# Altium footprint library 04.连接器件.pcb.PCBLIB: 363 footprints (part 18 of 23)
Each footprint in its own frame and in the unit in brackets; x right, y up, seen from the top. Pads: shape width x height; smd on the part's side, far side on the other; paste and mask are expansions set on the pad; w line width, h text height; cw(c..) or ccw(c..) is an arc to the next point about the centre after c.
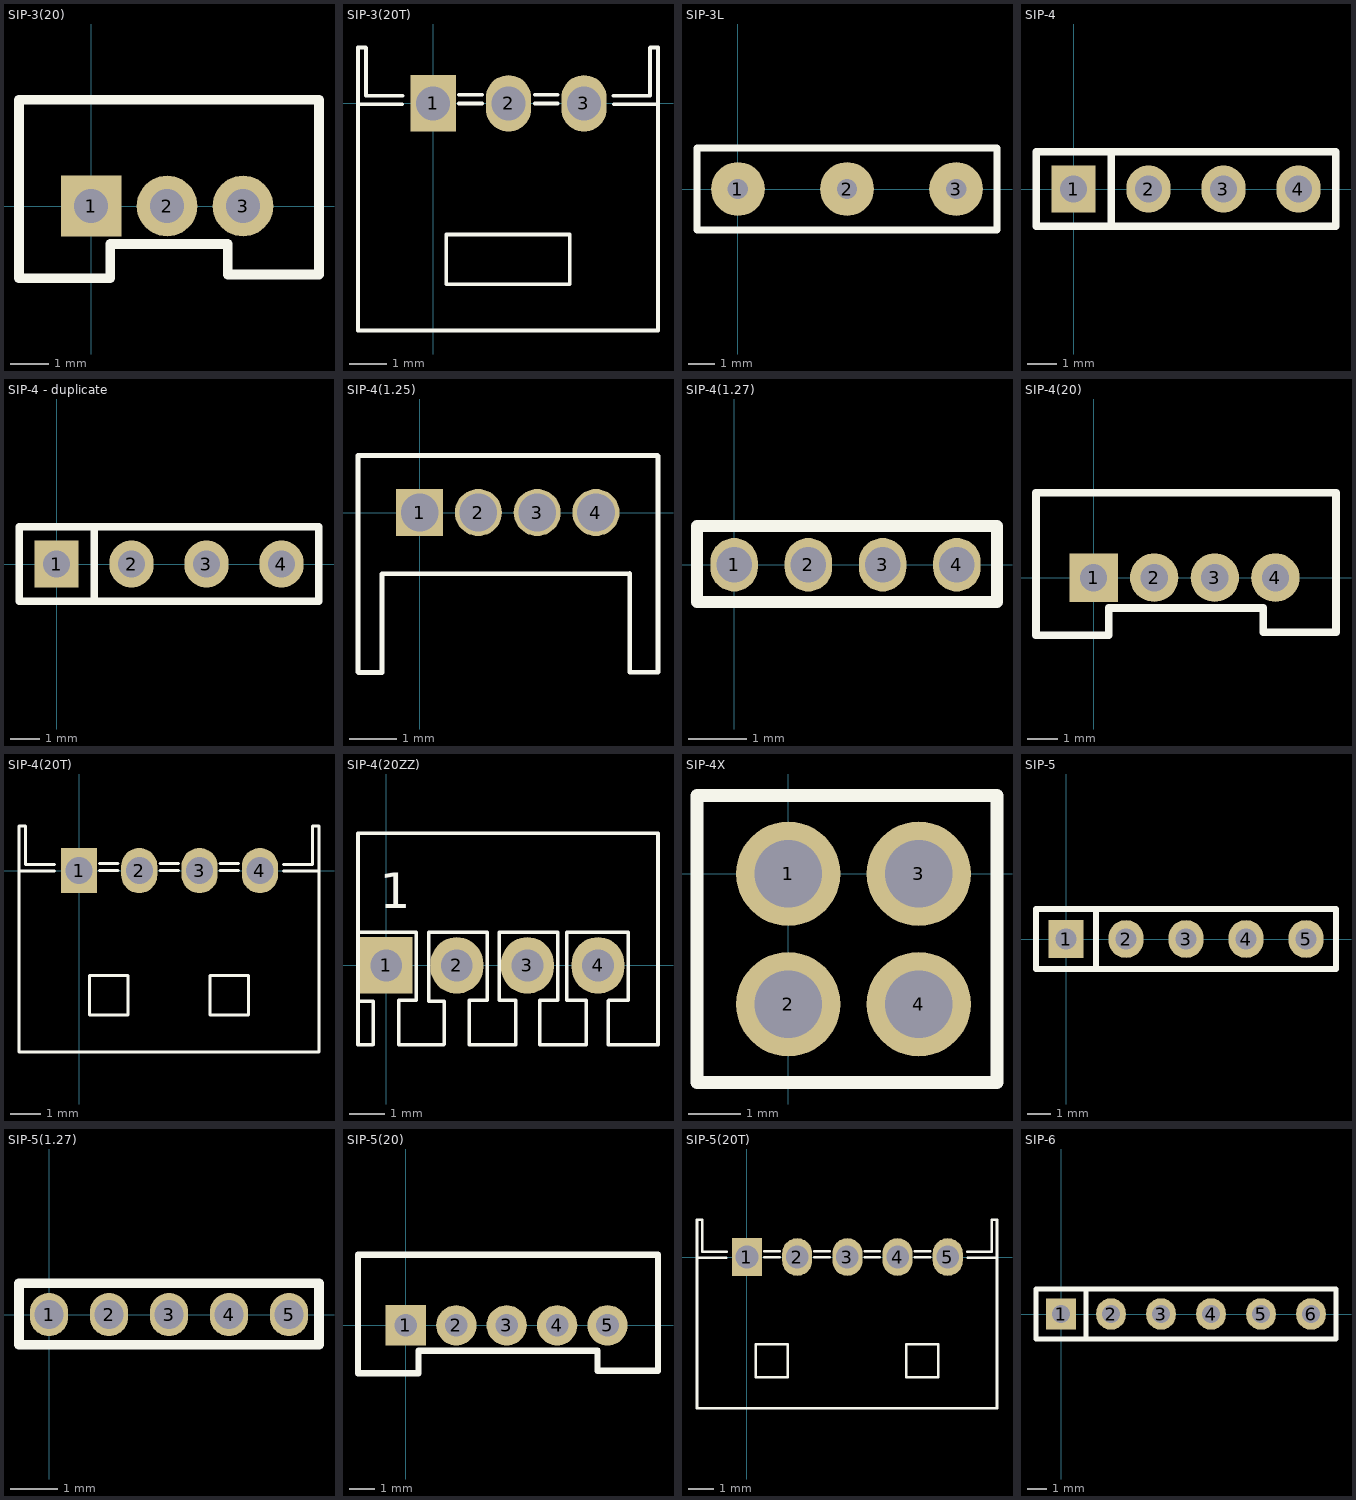
[diagram p17: the footprints below, top view; thin cyan lines are the x and y axes]

## SIP-3(20) [mm]
pads (3):
  rect 1.6x1.6 hole 0.9: 1(0,0)
  round 1.6 hole 0.9: 2(2,0) 3(4,0)
TopOverlay:
  lines w0.254: -1.9,2.8 6,2.8 6,-1.8 ; -1.9,2.8 -1.9,-1.9 0.5,-1.9 0.5,-1 3.6,-1 ; -1.9,2.8 -1.9,2.8 ; 3.6,-1 3.6,-1 ; 3.6,-1 3.6,-1.8 6,-1.8 ; 3.6,-1 3.6,-1 ; 3.6,-1 3.6,-1 ; 6,-1.8 6,-1.8

## SIP-3(20T) [mm]
pads (3):
  rect 1.2x1.5 hole 0.9: 1(0,0)
  oval 1.2x1.5 hole 0.9: 2(2,0) 3(4,0)
TopOverlay:
  lines w0.1: -1.992,-0.02 -0.818,-0.02 ; -0.813,0.203 -1.778,0.203 -1.778,1.473 -1.785,1.48 -1.992,1.48 -1.992,-6.02 2.934,-6.02 5.962,-6.02 5.962,1.48 5.755,1.48 5.748,1.473 5.748,0.203 4.783,0.203 ; 0.686,0 1.295,0 ; 0.686,0.229 1.295,0.229 ; 0.934,-4.795 2.934,-4.795 3.62,-4.795 3.62,-3.474 2.934,-3.474 0.934,-3.474 ; 1.036,-4.795 0.35,-4.795 0.35,-3.474 1.036,-3.474 ; 2.692,0 3.302,0 ; 2.692,0.229 3.302,0.229 ; 4.788,-0.02 5.962,-0.02

## SIP-3L [mm]
pads (3):
  round 2 hole 0.762: 1(0,0) 2(4.064,0) 3(8.128,0)
TopOverlay:
  lines w0.254: -1.524,-1.524 -1.524,-1.016 -1.524,1.524 9.652,1.524 9.652,-1.524 -1.524,-1.524

## SIP-4 [mm]
pads (4):
  rect 1.5x1.6 hole 0.9: 1(0,0)
  oval 1.5x1.6 hole 0.9: 2(2.54,0) 3(5.08,0) 4(7.62,0)
TopOverlay:
  lines w0.254: 1.27,-1.27 1.27,1.27 ; -1.27,-1.27 8.89,-1.27 8.89,1.27 -1.27,1.27 -1.27,-1.27

## SIP-4 - duplicate [mm]
pads (4):
  rect 1.5x1.6 hole 0.9: 1(0,0)
  oval 1.5x1.6 hole 0.9: 2(2.54,0) 3(5.08,0) 4(7.62,0)
TopOverlay:
  lines w0.254: 1.27,-1.27 1.27,1.27 ; -1.27,-1.27 -1.27,1.27 8.89,1.27 8.89,-1.27 -1.27,-1.27

## SIP-4(1.25) [mm]
pads (4):
  rect 1x1 hole 0.8: 1(0,0)
  round 1 hole 0.8: 2(1.25,0) 3(2.5,0) 4(3.75,0)
TopOverlay:
  lines w0.1: -1.31,-3.389 -1.31,1.211 5.063,1.211 ; -1.3,-3.4 -0.8,-3.4 -0.8,-1.3 4.464,-1.3 ; 4.469,-1.295 4.469,-3.395 5.069,-3.395 5.069,1.205

## SIP-4(1.27) [mil]
pads (4):
  oval 32x36 hole 24: 1(0,0) 2(50,0) 3(100,0) 4(150,0)
TopOverlay:
  lines w8: -25,-25 177,-25 ; -25,-24 -25,26 176,26 ; 177,-24 177,26

## SIP-4(20) [mm]
pads (4):
  rect 1.6x1.6 hole 0.9: 1(0,0)
  round 1.6 hole 0.9: 2(2,0) 3(4,0) 4(6,0)
TopOverlay:
  lines w0.254: -1.9,2.8 8,2.8 8,-1.8 ; -1.9,2.8 -1.9,-1.9 0.5,-1.9 0.5,-1 5.6,-1 ; -1.9,2.8 -1.9,2.8 ; 5.6,-1 5.6,-1 ; 5.6,-1 5.6,-1.8 8,-1.8 ; 5.6,-1 5.6,-1 ; 5.6,-1 5.6,-1 ; 8,-1.8 8,-1.8

## SIP-4(20T) [mm]
pads (4):
  rect 1.2x1.5 hole 0.9: 1(0,0)
  oval 1.2x1.5 hole 0.9: 2(2,0) 3(4,0) 4(6,0)
TopOverlay:
  lines w0.1: -1.992,-0.02 -0.818,-0.02 ; -0.813,0.203 -1.778,0.203 -1.778,1.473 -1.785,1.48 -1.992,1.48 -1.992,-6.02 4.934,-6.02 7.962,-6.02 7.962,1.48 7.755,1.48 7.748,1.473 7.748,0.203 6.783,0.203 ; 0.686,0 1.295,0 ; 0.686,0.229 1.295,0.229 ; 0.934,-4.795 1.62,-4.795 1.62,-3.474 0.934,-3.474 ; 1.036,-4.795 0.35,-4.795 0.35,-3.474 1.036,-3.474 ; 2.686,0 3.295,0 ; 2.686,0.229 3.295,0.229 ; 4.686,0 5.295,0 ; 4.686,0.229 5.295,0.229 ; 4.934,-4.795 5.62,-4.795 5.62,-3.474 4.934,-3.474 ; 5.036,-4.795 4.35,-4.795 4.35,-3.474 5.036,-3.474 ; 6.788,-0.02 7.962,-0.02

## SIP-4(20ZZ) [mm]
pads (4):
  rect 1.5x1.6 hole 0.9: 1(0,0)
  oval 1.5x1.6 hole 0.9: 2(2,0) 3(4,0) 4(6,0)
TopOverlay:
  lines w0.1: -0.8,-1.016 -0.362,-1.016 -0.362,-2.235 -0.377,-2.25 -0.8,-2.25 -0.8,0.94 ; 3.2,-2.25 3.623,-2.25 3.638,-2.235 ; 6.289,-1.005 6.289,-2.25 7.7,-2.25 7.7,3.75 -0.8,3.75 -0.8,0.94 ; 6.305,-0.991 6.864,-0.991 6.864,0.94 5.111,0.94 5.111,-0.991 5.67,-0.991 5.67,-2.25 4.349,-2.25 4.349,-0.991 4.857,-0.991 4.857,0.94 3.2,0.94 3.2,-0.991 3.67,-0.991 3.67,-2.25 2.349,-2.25 2.349,-0.991 2.857,-0.991 2.857,0.94 1.2,0.94 1.2,-1.016 1.638,-1.016 1.638,-2.235 1.623,-2.25 0.349,-2.25 0.349,-0.991 0.857,-0.991 0.857,0.94 -0.8,0.94
  text "1" at -0.178,1.626 h1

## SIP-4X [mm]
pads (4):
  round 2 hole 1.3: 1(0,0) 2(0,-2.5) 3(2.5,0) 4(2.5,-2.5)
TopOverlay:
  lines w0.254: -1.75,-4 -1.75,1.5 -1,1.5 4,1.5 4,-4 -1.75,-4

## SIP-5 [mm]
pads (5):
  rect 1.5x1.6 hole 0.9: 1(0,0)
  oval 1.5x1.6 hole 0.9: 2(2.54,0) 3(5.08,0) 4(7.62,0) 5(10.16,0)
TopOverlay:
  lines w0.254: 1.27,-1.27 1.27,1.27 ; -1.27,-1.27 -1.27,1.27 11.43,1.27 11.43,-1.27 -1.27,-1.27

## SIP-5(1.27) [mil]
pads (5):
  oval 32x36 hole 24: 1(0,0) 2(50,0) 3(100,0) 4(150,0) 5(200,0)
TopOverlay:
  lines w8: -25,-25 225,-25 225,25 ; -25,-24 -25,26 225,26

## SIP-5(20) [mm]
pads (5):
  rect 1.6x1.6 hole 0.9: 1(0,0)
  round 1.6 hole 0.9: 2(2,0) 3(4,0) 4(6,0) 5(8,0)
TopOverlay:
  lines w0.254: -1.9,2.8 -1.9,-1.9 0.5,-1.9 0.5,-1 7.6,-1 ; -1.9,2.8 -1.9,2.8 ; -1.9,2.8 10,2.8 10,-1.8 ; 7.6,-1 7.6,-1 ; 7.6,-1 7.6,-1.8 10,-1.8 ; 7.6,-1 7.6,-1 ; 7.6,-1 7.6,-1 ; 10,-1.8 10,-1.8

## SIP-5(20T) [mm]
pads (5):
  rect 1.2x1.5 hole 0.9: 1(0,0)
  oval 1.2x1.5 hole 0.9: 2(2,0) 3(4,0) 4(6,0) 5(8,0)
TopOverlay:
  lines w0.1: -1.992,-0.02 -0.818,-0.02 ; -0.813,0.203 -1.778,0.203 -1.778,1.473 -1.785,1.48 -1.992,1.48 -1.992,-6.02 6.934,-6.02 9.962,-6.02 9.962,1.48 9.755,1.48 9.748,1.473 9.748,0.203 8.783,0.203 ; 0.686,0 1.295,0 ; 0.686,0.229 1.295,0.229 ; 0.934,-4.795 1.62,-4.795 1.62,-3.474 0.934,-3.474 ; 1.036,-4.795 0.35,-4.795 0.35,-3.474 1.036,-3.474 ; 2.686,0 3.295,0 ; 2.686,0.229 3.295,0.229 ; 4.686,0 5.295,0 ; 4.686,0.229 5.295,0.229 ; 6.686,0 7.295,0 ; 6.686,0.229 7.295,0.229 ; 6.934,-4.795 7.62,-4.795 7.62,-3.474 6.934,-3.474 ; 7.036,-4.795 6.35,-4.795 6.35,-3.474 7.036,-3.474 ; 8.788,-0.02 9.962,-0.02

## SIP-6 [mm]
pads (6):
  rect 1.5x1.6 hole 0.9: 1(0,0)
  oval 1.5x1.6 hole 0.9: 2(2.54,0) 3(5.08,0) 4(7.62,0) 5(10.16,0) 6(12.7,0)
TopOverlay:
  lines w0.254: 1.27,-1.27 1.27,1.27 ; -1.27,-1.27 13.97,-1.27 13.97,1.27 -1.27,1.27 -1.27,-1.27